# Altium integrated library Altium_WCAP-AT1H (rev20b).IntLib: 94 symbols
Pins are listed as number, name and electrical type; pins without a type are passive.

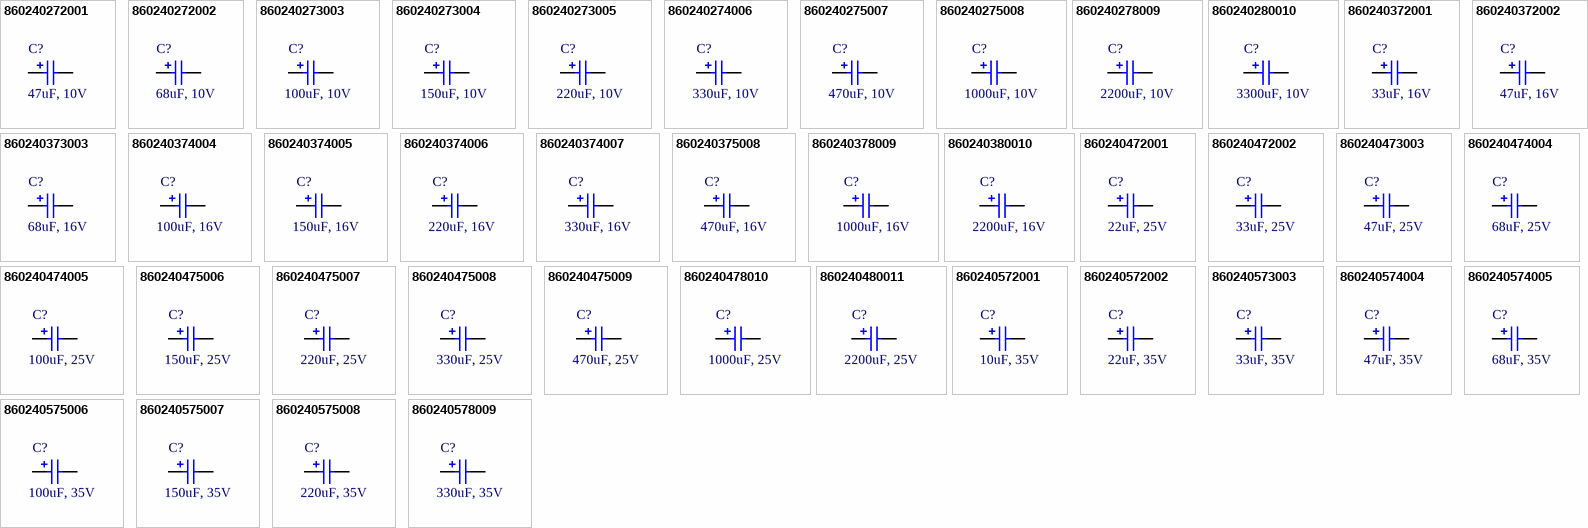
[diagram p0: symbols 860240272001 to 860240578009]

## 860240272001
designator C?, comment 47uF, 10V
WCAP-AT1H Aluminum Electrolytic Capacitor, Radial, THT, D5xH11mm, 47uF, 10V; Manufacturer Part Number: 860240272001; Manufacturer: Wurth Elektronik; Rated Voltage: 10VDC; Technical Reference: ATDC110470M010DSPA3E000; Ripple Current: 100mA; Capacitance Tolerance: +/-20%; Leakage Current: 4.7uA; Endurance: 5000h; Dissipation Factor: 19%; Published Date: October 2020; Operating Temperature: -40 to +105degC; Capacitance: 47uF; Packaging: Ammo Pack; Mounting Technology: THT; Height: 11mm; Diameter: 5mm; ComponentLink2URL: https://www.we-online.com/catalog/datasheet/860240272001.pdf; ComponentLink2Description: Datasheet; ComponentLink1URL: http://www.we-online.de; ComponentLink1Description: Manufacturer
footprint WCAP-AT1H_D5H11
pins: 1 P, 2 N

## 860240272002
designator C?, comment 68uF, 10V
WCAP-AT1H Aluminum Electrolytic Capacitor, Radial, THT, D5xH11mm, 68uF, 10V; Manufacturer Part Number: 860240272002; Manufacturer: Wurth Elektronik; Rated Voltage: 10VDC; Technical Reference: ATDC110680M010DSPA3E000; Ripple Current: 130mA; Capacitance Tolerance: +/-20%; Leakage Current: 6.8uA; Endurance: 5000h; Dissipation Factor: 19%; Published Date: October 2020; Operating Temperature: -40 to +105degC; Capacitance: 68uF; Packaging: Ammo Pack; Mounting Technology: THT; Height: 11mm; Diameter: 5mm; ComponentLink2URL: https://www.we-online.com/catalog/datasheet/860240272002.pdf; ComponentLink2Description: Datasheet; ComponentLink1URL: http://www.we-online.de; ComponentLink1Description: Manufacturer
footprint WCAP-AT1H_D5H11
pins: 1 P, 2 N

## 860240273003
designator C?, comment 100uF, 10V
WCAP-AT1H Aluminum Electrolytic Capacitor, Radial, THT, D6.3xH11mm, 100uF, 10V; Manufacturer Part Number: 860240273003; Manufacturer: Wurth Elektronik; Rated Voltage: 10VDC; Technical Reference: ATDD110101M010DSPA4E000; Ripple Current: 190mA; Capacitance Tolerance: +/-20%; Leakage Current: 10uA; Endurance: 5000h; Dissipation Factor: 19%; Published Date: October 2020; Operating Temperature: -40 to +105degC; Capacitance: 100uF; Packaging: Ammo Pack; Mounting Technology: THT; Height: 11mm; Diameter: 6.3mm; ComponentLink2URL: https://www.we-online.com/catalog/datasheet/860240273003.pdf; ComponentLink2Description: Datasheet; ComponentLink1URL: http://www.we-online.de; ComponentLink1Description: Manufacturer
footprint WCAP-AT1H_D6.3H11
pins: 1 P, 2 N

## 860240273004
designator C?, comment 150uF, 10V
WCAP-AT1H Aluminum Electrolytic Capacitor, Radial, THT, D6.3xH11mm, 150uF, 10V; Manufacturer Part Number: 860240273004; Manufacturer: Wurth Elektronik; Rated Voltage: 10VDC; Technical Reference: ATDD110151M010DSPA4E000; Ripple Current: 220mA; Capacitance Tolerance: +/-20%; Leakage Current: 15uA; Endurance: 5000h; Dissipation Factor: 19%; Published Date: October 2020; Operating Temperature: -40 to +105degC; Capacitance: 150uF; Packaging: Ammo Pack; Mounting Technology: THT; Height: 11mm; Diameter: 6.3mm; ComponentLink2URL: https://www.we-online.com/catalog/datasheet/860240273004.pdf; ComponentLink2Description: Datasheet; ComponentLink1URL: http://www.we-online.de; ComponentLink1Description: Manufacturer
footprint WCAP-AT1H_D6.3H11
pins: 1 P, 2 N

## 860240273005
designator C?, comment 220uF, 10V
WCAP-AT1H Aluminum Electrolytic Capacitor, Radial, THT, D6.3xH11mm, 220uF, 10V; Manufacturer Part Number: 860240273005; Manufacturer: Wurth Elektronik; Rated Voltage: 10VDC; Technical Reference: ATDD110221M010DSPA4E000; Ripple Current: 270mA; Capacitance Tolerance: +/-20%; Leakage Current: 22uA; Endurance: 5000h; Dissipation Factor: 19%; Published Date: October 2020; Operating Temperature: -40 to +105degC; Capacitance: 220uF; Packaging: Ammo Pack; Mounting Technology: THT; Height: 11mm; Diameter: 6.3mm; ComponentLink2URL: https://www.we-online.com/catalog/datasheet/860240273005.pdf; ComponentLink2Description: Datasheet; ComponentLink1URL: http://www.we-online.de; ComponentLink1Description: Manufacturer
footprint WCAP-AT1H_D6.3H11
pins: 1 P, 2 N

## 860240274006
designator C?, comment 330uF, 10V
WCAP-AT1H Aluminum Electrolytic Capacitor, Radial, THT, D8xH11.5mm, 330uF, 10V; Manufacturer Part Number: 860240274006; Manufacturer: Wurth Elektronik; Rated Voltage: 10VDC; Technical Reference: ATDE115331M010DSPA7H000; Ripple Current: 390mA; Capacitance Tolerance: +/-20%; Leakage Current: 33uA; Endurance: 8000h; Dissipation Factor: 19%; Published Date: October 2020; Operating Temperature: -40 to +105degC; Capacitance: 330uF; Packaging: Ammo Pack; Mounting Technology: THT; Height: 11.5mm; Diameter: 8mm; ComponentLink2URL: https://www.we-online.com/catalog/datasheet/860240274006.pdf; ComponentLink2Description: Datasheet; ComponentLink1URL: http://www.we-online.de; ComponentLink1Description: Manufacturer
footprint WCAP-AT1H_D8H11.5
pins: 1 P, 2 N

## 860240275007
designator C?, comment 470uF, 10V
WCAP-AT1H Aluminum Electrolytic Capacitor, Radial, THT, D10xH12.5mm, 470uF, 10V; Manufacturer Part Number: 860240275007; Manufacturer: Wurth Elektronik; Rated Voltage: 10VDC; Technical Reference: ATDF125471M010DSPA9K000; Ripple Current: 540mA; Capacitance Tolerance: +/-20%; Leakage Current: 47uA; Endurance: 10000h; Dissipation Factor: 19%; Published Date: October 2020; Operating Temperature: -40 to +105degC; Capacitance: 470uF; Packaging: Ammo Pack; Mounting Technology: THT; Height: 12.5mm; Diameter: 10mm; ComponentLink2URL: https://www.we-online.com/catalog/datasheet/860240275007.pdf; ComponentLink2Description: Datasheet; ComponentLink1URL: http://www.we-online.de; ComponentLink1Description: Manufacturer
footprint WCAP-AT1H_D10H12.5
pins: 1 P, 2 N

## 860240275008
designator C?, comment 1000uF, 10V
WCAP-AT1H Aluminum Electrolytic Capacitor, Radial, THT, D10xH16mm, 1000uF, 10V; Manufacturer Part Number: 860240275008; Manufacturer: Wurth Elektronik; Rated Voltage: 10VDC; Technical Reference: ATDF160102M010DSPAAK000; Ripple Current: 900mA; Capacitance Tolerance: +/-20%; Leakage Current: 100uA; Endurance: 10000h; Dissipation Factor: 19%; Published Date: October 2020; Operating Temperature: -40 to +105degC; Capacitance: 1000uF; Packaging: Ammo Pack; Mounting Technology: THT; Height: 16mm; Diameter: 10mm; ComponentLink2URL: https://www.we-online.com/catalog/datasheet/860240275008.pdf; ComponentLink2Description: Datasheet; ComponentLink1URL: http://www.we-online.de; ComponentLink1Description: Manufacturer
footprint WCAP-AT1H_D10H16
pins: 1 P, 2 N

## 860240278009
designator C?, comment 2200uF, 10V
WCAP-AT1H Aluminum Electrolytic Capacitor, Radial, THT, D13xH20mm, 2200uF, 10V; Manufacturer Part Number: 860240278009; Manufacturer: Wurth Elektronik; Rated Voltage: 10VDC; Technical Reference: ATDI200222M010DSPACK000; Ripple Current: 1540mA; Capacitance Tolerance: +/-20%; Leakage Current: 220uA; Endurance: 10000h; Dissipation Factor: 19%; Published Date: October 2020; Operating Temperature: -40 to +105degC; Capacitance: 2200uF; Packaging: Ammo Pack; Mounting Technology: THT; Height: 20mm; Diameter: 13mm; ComponentLink2URL: https://www.we-online.com/catalog/datasheet/860240278009.pdf; ComponentLink2Description: Datasheet; ComponentLink1URL: http://www.we-online.de; ComponentLink1Description: Manufacturer
footprint WCAP-AT1H_D13H20
pins: 1 P, 2 N

## 860240280010
designator C?, comment 3300uF, 10V
WCAP-AT1H Aluminum Electrolytic Capacitor, Radial, THT, D16xH25mm, 3300uF, 10V; Manufacturer Part Number: 860240280010; Manufacturer: Wurth Elektronik; Rated Voltage: 10VDC; Technical Reference: ATDK250332M010DSPAEK000; Ripple Current: 1900mA; Capacitance Tolerance: +/-20%; Leakage Current: 330uA; Endurance: 10000h; Dissipation Factor: 19%; Published Date: October 2020; Operating Temperature: -40 to +105degC; Capacitance: 3300uF; Packaging: Ammo Pack; Mounting Technology: THT; Height: 25mm; Diameter: 16mm; ComponentLink2URL: https://www.we-online.com/catalog/datasheet/860240280010.pdf; ComponentLink2Description: Datasheet; ComponentLink1URL: http://www.we-online.de; ComponentLink1Description: Manufacturer
footprint WCAP-AT1H_D16H25
pins: 1 P, 2 N

## 860240372001
designator C?, comment 33uF, 16V
WCAP-AT1H Aluminum Electrolytic Capacitor, Radial, THT, D5xH11mm, 33uF, 16V; Manufacturer Part Number: 860240372001; Manufacturer: Wurth Elektronik; Rated Voltage: 16VDC; Technical Reference: ATDC110330M016DSPA3E000; Ripple Current: 115mA; Capacitance Tolerance: +/-20%; Leakage Current: 5.28uA; Endurance: 5000h; Dissipation Factor: 16%; Published Date: October 2020; Operating Temperature: -40 to +105degC; Capacitance: 33uF; Packaging: Ammo Pack; Mounting Technology: THT; Height: 11mm; Diameter: 5mm; ComponentLink2URL: https://www.we-online.com/catalog/datasheet/860240372001.pdf; ComponentLink2Description: Datasheet; ComponentLink1URL: http://www.we-online.de; ComponentLink1Description: Manufacturer
footprint WCAP-AT1H_D5H11
pins: 1 P, 2 N

## 860240372002
designator C?, comment 47uF, 16V
WCAP-AT1H Aluminum Electrolytic Capacitor, Radial, THT, D5xH11mm, 47uF, 16V; Manufacturer Part Number: 860240372002; Manufacturer: Wurth Elektronik; Rated Voltage: 16VDC; Technical Reference: ATDC110470M016DSPA3E000; Ripple Current: 145mA; Capacitance Tolerance: +/-20%; Leakage Current: 7.52uA; Endurance: 5000h; Dissipation Factor: 16%; Published Date: October 2020; Operating Temperature: -40 to +105degC; Capacitance: 47uF; Packaging: Ammo Pack; Mounting Technology: THT; Height: 11mm; Diameter: 5mm; ComponentLink2URL: https://www.we-online.com/catalog/datasheet/860240372002.pdf; ComponentLink2Description: Datasheet; ComponentLink1URL: http://www.we-online.de; ComponentLink1Description: Manufacturer
footprint WCAP-AT1H_D5H11
pins: 1 P, 2 N

## 860240373003
designator C?, comment 68uF, 16V
WCAP-AT1H Aluminum Electrolytic Capacitor, Radial, THT, D6.3xH11mm, 68uF, 16V; Manufacturer Part Number: 860240373003; Manufacturer: Wurth Elektronik; Rated Voltage: 16VDC; Technical Reference: ATDD110680M016DSPA4E000; Ripple Current: 200mA; Capacitance Tolerance: +/-20%; Leakage Current: 10.88uA; Endurance: 5000h; Dissipation Factor: 16%; Published Date: October 2020; Operating Temperature: -40 to +105degC; Capacitance: 68uF; Packaging: Ammo Pack; Mounting Technology: THT; Height: 11mm; Diameter: 6.3mm; ComponentLink2URL: https://www.we-online.com/catalog/datasheet/860240373003.pdf; ComponentLink2Description: Datasheet; ComponentLink1URL: http://www.we-online.de; ComponentLink1Description: Manufacturer
footprint WCAP-AT1H_D6.3H11
pins: 1 P, 2 N

## 860240374004
designator C?, comment 100uF, 16V
WCAP-AT1H Aluminum Electrolytic Capacitor, Radial, THT, D8xH11.5mm, 100uF, 16V; Manufacturer Part Number: 860240374004; Manufacturer: Wurth Elektronik; Rated Voltage: 16VDC; Technical Reference: ATDE115101M016DSPA7H000; Ripple Current: 245mA; Capacitance Tolerance: +/-20%; Leakage Current: 16uA; Endurance: 8000h; Dissipation Factor: 16%; Published Date: October 2020; Operating Temperature: -40 to +105degC; Capacitance: 100uF; Packaging: Ammo Pack; Mounting Technology: THT; Height: 11.5mm; Diameter: 8mm; ComponentLink2URL: https://www.we-online.com/catalog/datasheet/860240374004.pdf; ComponentLink2Description: Datasheet; ComponentLink1URL: http://www.we-online.de; ComponentLink1Description: Manufacturer
footprint WCAP-AT1H_D8H11.5
pins: 1 P, 2 N

## 860240374005
designator C?, comment 150uF, 16V
WCAP-AT1H Aluminum Electrolytic Capacitor, Radial, THT, D8xH11.5mm, 150uF, 16V; Manufacturer Part Number: 860240374005; Manufacturer: Wurth Elektronik; Rated Voltage: 16VDC; Technical Reference: ATDE115151M016DSPA7H000; Ripple Current: 300mA; Capacitance Tolerance: +/-20%; Leakage Current: 24uA; Endurance: 8000h; Dissipation Factor: 16%; Published Date: October 2020; Operating Temperature: -40 to +105degC; Capacitance: 150uF; Packaging: Ammo Pack; Mounting Technology: THT; Height: 11.5mm; Diameter: 8mm; ComponentLink2URL: https://www.we-online.com/catalog/datasheet/860240374005.pdf; ComponentLink2Description: Datasheet; ComponentLink1URL: http://www.we-online.de; ComponentLink1Description: Manufacturer
footprint WCAP-AT1H_D8H11.5
pins: 1 P, 2 N

## 860240374006
designator C?, comment 220uF, 16V
WCAP-AT1H Aluminum Electrolytic Capacitor, Radial, THT, D8xH11.5mm, 220uF, 16V; Manufacturer Part Number: 860240374006; Manufacturer: Wurth Elektronik; Rated Voltage: 16VDC; Technical Reference: ATDE115221M016DSPA7H000; Ripple Current: 420mA; Capacitance Tolerance: +/-20%; Leakage Current: 35.2uA; Endurance: 8000h; Dissipation Factor: 16%; Published Date: October 2020; Operating Temperature: -40 to +105degC; Capacitance: 220uF; Packaging: Ammo Pack; Mounting Technology: THT; Height: 11.5mm; Diameter: 8mm; ComponentLink2URL: https://www.we-online.com/catalog/datasheet/860240374006.pdf; ComponentLink2Description: Datasheet; ComponentLink1URL: http://www.we-online.de; ComponentLink1Description: Manufacturer
footprint WCAP-AT1H_D8H11.5
pins: 1 P, 2 N

## 860240374007
designator C?, comment 330uF, 16V
WCAP-AT1H Aluminum Electrolytic Capacitor, Radial, THT, D8xH16mm, 330uF, 16V; Manufacturer Part Number: 860240374007; Manufacturer: Wurth Elektronik; Rated Voltage: 16VDC; Technical Reference: ATDE160331M016DSPA7H000; Ripple Current: 500mA; Capacitance Tolerance: +/-20%; Leakage Current: 52.8uA; Endurance: 8000h; Dissipation Factor: 16%; Published Date: October 2020; Operating Temperature: -40 to +105degC; Capacitance: 330uF; Packaging: Ammo Pack; Mounting Technology: THT; Height: 16mm; Diameter: 8mm; ComponentLink2URL: https://www.we-online.com/catalog/datasheet/860240374007.pdf; ComponentLink2Description: Datasheet; ComponentLink1URL: http://www.we-online.de; ComponentLink1Description: Manufacturer
footprint WCAP-AT1H_D8H16
pins: 1 P, 2 N

## 860240375008
designator C?, comment 470uF, 16V
WCAP-AT1H Aluminum Electrolytic Capacitor, Radial, THT, D10xH16mm, 470uF, 16V; Manufacturer Part Number: 860240375008; Manufacturer: Wurth Elektronik; Rated Voltage: 16VDC; Technical Reference: ATDF160471M016DSPAAK000; Ripple Current: 730mA; Capacitance Tolerance: +/-20%; Leakage Current: 75.2uA; Endurance: 10000h; Dissipation Factor: 16%; Published Date: October 2020; Operating Temperature: -40 to +105degC; Capacitance: 470uF; Packaging: Ammo Pack; Mounting Technology: THT; Height: 16mm; Diameter: 10mm; ComponentLink2URL: https://www.we-online.com/catalog/datasheet/860240375008.pdf; ComponentLink2Description: Datasheet; ComponentLink1URL: http://www.we-online.de; ComponentLink1Description: Manufacturer
footprint WCAP-AT1H_D10H16
pins: 1 P, 2 N

## 860240378009
designator C?, comment 1000uF, 16V
WCAP-AT1H Aluminum Electrolytic Capacitor, Radial, THT, D13xH20mm, 1000uF, 16V; Manufacturer Part Number: 860240378009; Manufacturer: Wurth Elektronik; Rated Voltage: 16VDC; Technical Reference: ATDI200102M016DSPACK000; Ripple Current: 1173mA; Capacitance Tolerance: +/-20%; Leakage Current: 160uA; Endurance: 10000h; Dissipation Factor: 16%; Published Date: October 2020; Operating Temperature: -40 to +105degC; Capacitance: 1000uF; Packaging: Ammo Pack; Mounting Technology: THT; Height: 20mm; Diameter: 13mm; ComponentLink2URL: https://www.we-online.com/catalog/datasheet/860240378009.pdf; ComponentLink2Description: Datasheet; ComponentLink1URL: http://www.we-online.de; ComponentLink1Description: Manufacturer
footprint WCAP-AT1H_D13H20
pins: 1 P, 2 N

## 860240380010
designator C?, comment 2200uF, 16V
WCAP-AT1H Aluminum Electrolytic Capacitor, Radial, THT, D16xH25mm, 2200uF, 16V; Manufacturer Part Number: 860240380010; Manufacturer: Wurth Elektronik; Rated Voltage: 16VDC; Technical Reference: ATDK250222M016DSPAEK000; Ripple Current: 2093mA; Capacitance Tolerance: +/-20%; Leakage Current: 352uA; Endurance: 10000h; Dissipation Factor: 16%; Published Date: October 2020; Operating Temperature: -40 to +105degC; Capacitance: 2200uF; Packaging: Ammo Pack; Mounting Technology: THT; Height: 25mm; Diameter: 16mm; ComponentLink2URL: https://www.we-online.com/catalog/datasheet/860240380010.pdf; ComponentLink2Description: Datasheet; ComponentLink1URL: http://www.we-online.de; ComponentLink1Description: Manufacturer
footprint WCAP-AT1H_D16H25
pins: 1 P, 2 N

## 860240472001
designator C?, comment 22uF, 25V
WCAP-AT1H Aluminum Electrolytic Capacitor, Radial, THT, D5xH11mm, 22uF, 25V; Manufacturer Part Number: 860240472001; Manufacturer: Wurth Elektronik; Rated Voltage: 25VDC; Technical Reference: ATDC110220M025DSPA3E000; Ripple Current: 100mA; Capacitance Tolerance: +/-20%; Leakage Current: 5.5uA; Endurance: 5000h; Dissipation Factor: 14%; Published Date: October 2020; Operating Temperature: -40 to +105degC; Capacitance: 22uF; Packaging: Ammo Pack; Mounting Technology: THT; Height: 11mm; Diameter: 5mm; ComponentLink2URL: https://www.we-online.com/catalog/datasheet/860240472001.pdf; ComponentLink2Description: Datasheet; ComponentLink1URL: http://www.we-online.de; ComponentLink1Description: Manufacturer
footprint WCAP-AT1H_D5H11
pins: 1 P, 2 N

## 860240472002
designator C?, comment 33uF, 25V
WCAP-AT1H Aluminum Electrolytic Capacitor, Radial, THT, D5xH11mm, 33uF, 25V; Manufacturer Part Number: 860240472002; Manufacturer: Wurth Elektronik; Rated Voltage: 25VDC; Technical Reference: ATDC110330M025DSPA3E000; Ripple Current: 130mA; Capacitance Tolerance: +/-20%; Leakage Current: 8.25uA; Endurance: 5000h; Dissipation Factor: 14%; Published Date: October 2020; Operating Temperature: -40 to +105degC; Capacitance: 33uF; Packaging: Ammo Pack; Mounting Technology: THT; Height: 11mm; Diameter: 5mm; ComponentLink2URL: https://www.we-online.com/catalog/datasheet/860240472002.pdf; ComponentLink2Description: Datasheet; ComponentLink1URL: http://www.we-online.de; ComponentLink1Description: Manufacturer
footprint WCAP-AT1H_D5H11
pins: 1 P, 2 N

## 860240473003
designator C?, comment 47uF, 25V
WCAP-AT1H Aluminum Electrolytic Capacitor, Radial, THT, D6.3xH11mm, 47uF, 25V; Manufacturer Part Number: 860240473003; Manufacturer: Wurth Elektronik; Rated Voltage: 25VDC; Technical Reference: ATDD110470M025DSPA4E000; Ripple Current: 160mA; Capacitance Tolerance: +/-20%; Leakage Current: 11.75uA; Endurance: 5000h; Dissipation Factor: 14%; Published Date: October 2020; Operating Temperature: -40 to +105degC; Capacitance: 47uF; Packaging: Ammo Pack; Mounting Technology: THT; Height: 11mm; Diameter: 6.3mm; ComponentLink2URL: https://www.we-online.com/catalog/datasheet/860240473003.pdf; ComponentLink2Description: Datasheet; ComponentLink1URL: http://www.we-online.de; ComponentLink1Description: Manufacturer
footprint WCAP-AT1H_D6.3H11
pins: 1 P, 2 N

## 860240474004
designator C?, comment 68uF, 25V
WCAP-AT1H Aluminum Electrolytic Capacitor, Radial, THT, D8xH11.5mm, 68uF, 25V; Manufacturer Part Number: 860240474004; Manufacturer: Wurth Elektronik; Rated Voltage: 25VDC; Technical Reference: ATDE115680M025DSPA7H000; Ripple Current: 230mA; Capacitance Tolerance: +/-20%; Leakage Current: 17uA; Endurance: 8000h; Dissipation Factor: 14%; Published Date: October 2020; Operating Temperature: -40 to +105degC; Capacitance: 68uF; Packaging: Ammo Pack; Mounting Technology: THT; Height: 11.5mm; Diameter: 8mm; ComponentLink2URL: https://www.we-online.com/catalog/datasheet/860240474004.pdf; ComponentLink2Description: Datasheet; ComponentLink1URL: http://www.we-online.de; ComponentLink1Description: Manufacturer
footprint WCAP-AT1H_D8H11.5
pins: 1 P, 2 N

## 860240474005
designator C?, comment 100uF, 25V
WCAP-AT1H Aluminum Electrolytic Capacitor, Radial, THT, D8xH11.5mm, 100uF, 25V; Manufacturer Part Number: 860240474005; Manufacturer: Wurth Elektronik; Rated Voltage: 25VDC; Technical Reference: ATDE115101M025DSPA7H000; Ripple Current: 327mA; Capacitance Tolerance: +/-20%; Leakage Current: 25uA; Endurance: 8000h; Dissipation Factor: 14%; Published Date: October 2020; Operating Temperature: -40 to +105degC; Capacitance: 100uF; Packaging: Ammo Pack; Mounting Technology: THT; Height: 11.5mm; Diameter: 8mm; ComponentLink2URL: https://www.we-online.com/catalog/datasheet/860240474005.pdf; ComponentLink2Description: Datasheet; ComponentLink1URL: http://www.we-online.de; ComponentLink1Description: Manufacturer
footprint WCAP-AT1H_D8H11.5
pins: 1 P, 2 N

## 860240475006
designator C?, comment 150uF, 25V
WCAP-AT1H Aluminum Electrolytic Capacitor, Radial, THT, D10xH12.5mm, 150uF, 25V; Manufacturer Part Number: 860240475006; Manufacturer: Wurth Elektronik; Rated Voltage: 25VDC; Technical Reference: ATDF125151M025DSPA9K000; Ripple Current: 460mA; Capacitance Tolerance: +/-20%; Leakage Current: 37.5uA; Endurance: 10000h; Dissipation Factor: 14%; Published Date: October 2020; Operating Temperature: -40 to +105degC; Capacitance: 150uF; Packaging: Ammo Pack; Mounting Technology: THT; Height: 12.5mm; Diameter: 10mm; ComponentLink2URL: https://www.we-online.com/catalog/datasheet/860240475006.pdf; ComponentLink2Description: Datasheet; ComponentLink1URL: http://www.we-online.de; ComponentLink1Description: Manufacturer
footprint WCAP-AT1H_D10H12.5
pins: 1 P, 2 N

## 860240475007
designator C?, comment 220uF, 25V
WCAP-AT1H Aluminum Electrolytic Capacitor, Radial, THT, D10xH16mm, 220uF, 25V; Manufacturer Part Number: 860240475007; Manufacturer: Wurth Elektronik; Rated Voltage: 25VDC; Technical Reference: ATDF160221M025DSPAAK000; Ripple Current: 580mA; Capacitance Tolerance: +/-20%; Leakage Current: 55uA; Endurance: 10000h; Dissipation Factor: 14%; Published Date: October 2020; Operating Temperature: -40 to +105degC; Capacitance: 220uF; Packaging: Ammo Pack; Mounting Technology: THT; Height: 16mm; Diameter: 10mm; ComponentLink2URL: https://www.we-online.com/catalog/datasheet/860240475007.pdf; ComponentLink2Description: Datasheet; ComponentLink1URL: http://www.we-online.de; ComponentLink1Description: Manufacturer
footprint WCAP-AT1H_D10H16
pins: 1 P, 2 N

## 860240475008
designator C?, comment 330uF, 25V
WCAP-AT1H Aluminum Electrolytic Capacitor, Radial, THT, D10xH20mm, 330uF, 25V; Manufacturer Part Number: 860240475008; Manufacturer: Wurth Elektronik; Rated Voltage: 25VDC; Technical Reference: ATDF200331M025DSPAAK000; Ripple Current: 805mA; Capacitance Tolerance: +/-20%; Leakage Current: 82.5uA; Endurance: 10000h; Dissipation Factor: 14%; Published Date: October 2020; Operating Temperature: -40 to +105degC; Capacitance: 330uF; Packaging: Ammo Pack; Mounting Technology: THT; Height: 20mm; Diameter: 10mm; ComponentLink2URL: https://www.we-online.com/catalog/datasheet/860240475008.pdf; ComponentLink2Description: Datasheet; ComponentLink1URL: http://www.we-online.de; ComponentLink1Description: Manufacturer
footprint WCAP-AT1H_D10H20
pins: 1 P, 2 N

## 860240475009
designator C?, comment 470uF, 25V
WCAP-AT1H Aluminum Electrolytic Capacitor, Radial, THT, D10xH20mm, 470uF, 25V; Manufacturer Part Number: 860240475009; Manufacturer: Wurth Elektronik; Rated Voltage: 25VDC; Technical Reference: ATDF200471M025DSPAAK000; Ripple Current: 950mA; Capacitance Tolerance: +/-20%; Leakage Current: 117.5uA; Endurance: 10000h; Dissipation Factor: 14%; Published Date: October 2020; Operating Temperature: -40 to +105degC; Capacitance: 470uF; Packaging: Ammo Pack; Mounting Technology: THT; Height: 20mm; Diameter: 10mm; ComponentLink2URL: https://www.we-online.com/catalog/datasheet/860240475009.pdf; ComponentLink2Description: Datasheet; ComponentLink1URL: http://www.we-online.de; ComponentLink1Description: Manufacturer
footprint WCAP-AT1H_D10H20
pins: 1 P, 2 N

## 860240478010
designator C?, comment 1000uF, 25V
WCAP-AT1H Aluminum Electrolytic Capacitor, Radial, THT, D13xH25mm, 1000uF, 25V; Manufacturer Part Number: 860240478010; Manufacturer: Wurth Elektronik; Rated Voltage: 25VDC; Technical Reference: ATDI250102M025DSPACK000; Ripple Current: 1552mA; Capacitance Tolerance: +/-20%; Leakage Current: 250uA; Endurance: 10000h; Dissipation Factor: 14%; Published Date: October 2020; Operating Temperature: -40 to +105degC; Capacitance: 1000uF; Packaging: Ammo Pack; Mounting Technology: THT; Height: 25mm; Diameter: 13mm; ComponentLink2URL: https://www.we-online.com/catalog/datasheet/860240478010.pdf; ComponentLink2Description: Datasheet; ComponentLink1URL: http://www.we-online.de; ComponentLink1Description: Manufacturer
footprint WCAP-AT1H_D13H25
pins: 1 P, 2 N

## 860240480011
designator C?, comment 2200uF, 25V
WCAP-AT1H Aluminum Electrolytic Capacitor, Radial, THT, D16xH31.5mm, 2200uF, 25V; Manufacturer Part Number: 860240480011; Manufacturer: Wurth Elektronik; Rated Voltage: 25VDC; Technical Reference: ATDK315222M025DSPADK000; Ripple Current: 2400mA; Capacitance Tolerance: +/-20%; Leakage Current: 550uA; Endurance: 10000h; Dissipation Factor: 14%; Published Date: October 2020; Operating Temperature: -40 to +105degC; Capacitance: 2200uF; Packaging: Ammo Pack; Mounting Technology: THT; Height: 31.5mm; Diameter: 16mm; ComponentLink2URL: https://www.we-online.com/catalog/datasheet/860240480011.pdf; ComponentLink2Description: Datasheet; ComponentLink1URL: http://www.we-online.de; ComponentLink1Description: Manufacturer
footprint WCAP-AT1H_D16H31.5
pins: 1 P, 2 N

## 860240572001
designator C?, comment 10uF, 35V
WCAP-AT1H Aluminum Electrolytic Capacitor, Radial, THT, D5xH11mm, 10uF, 35V; Manufacturer Part Number: 860240572001; Manufacturer: Wurth Elektronik; Rated Voltage: 35VDC; Technical Reference: ATDC110100M035DSPA3E000; Ripple Current: 65mA; Capacitance Tolerance: +/-20%; Leakage Current: 3.5uA; Endurance: 5000h; Dissipation Factor: 12%; Published Date: October 2020; Operating Temperature: -40 to +105degC; Capacitance: 10uF; Packaging: Ammo Pack; Mounting Technology: THT; Height: 11mm; Diameter: 5mm; ComponentLink2URL: https://www.we-online.com/catalog/datasheet/860240572001.pdf; ComponentLink2Description: Datasheet; ComponentLink1URL: http://www.we-online.de; ComponentLink1Description: Manufacturer
footprint WCAP-AT1H_D5H11
pins: 1 P, 2 N

## 860240572002
designator C?, comment 22uF, 35V
WCAP-AT1H Aluminum Electrolytic Capacitor, Radial, THT, D5xH11mm, 22uF, 35V; Manufacturer Part Number: 860240572002; Manufacturer: Wurth Elektronik; Rated Voltage: 35VDC; Technical Reference: ATDC110220M035DSPA3E000; Ripple Current: 125mA; Capacitance Tolerance: +/-20%; Leakage Current: 7.7uA; Endurance: 5000h; Dissipation Factor: 12%; Published Date: October 2020; Operating Temperature: -40 to +105degC; Capacitance: 22uF; Packaging: Ammo Pack; Mounting Technology: THT; Height: 11mm; Diameter: 5mm; ComponentLink2URL: https://www.we-online.com/catalog/datasheet/860240572002.pdf; ComponentLink2Description: Datasheet; ComponentLink1URL: http://www.we-online.de; ComponentLink1Description: Manufacturer
footprint WCAP-AT1H_D5H11
pins: 1 P, 2 N

## 860240573003
designator C?, comment 33uF, 35V
WCAP-AT1H Aluminum Electrolytic Capacitor, Radial, THT, D6.3xH11mm, 33uF, 35V; Manufacturer Part Number: 860240573003; Manufacturer: Wurth Elektronik; Rated Voltage: 35VDC; Technical Reference: ATDD110330M035DSPA4E000; Ripple Current: 178mA; Capacitance Tolerance: +/-20%; Leakage Current: 11.55uA; Endurance: 5000h; Dissipation Factor: 12%; Published Date: October 2020; Operating Temperature: -40 to +105degC; Capacitance: 33uF; Packaging: Ammo Pack; Mounting Technology: THT; Height: 11mm; Diameter: 6.3mm; ComponentLink2URL: https://www.we-online.com/catalog/datasheet/860240573003.pdf; ComponentLink2Description: Datasheet; ComponentLink1URL: http://www.we-online.de; ComponentLink1Description: Manufacturer
footprint WCAP-AT1H_D6.3H11
pins: 1 P, 2 N

## 860240574004
designator C?, comment 47uF, 35V
WCAP-AT1H Aluminum Electrolytic Capacitor, Radial, THT, D8xH11.5mm, 47uF, 35V; Manufacturer Part Number: 860240574004; Manufacturer: Wurth Elektronik; Rated Voltage: 35VDC; Technical Reference: ATDE115470M035DSPA7H000; Ripple Current: 240mA; Capacitance Tolerance: +/-20%; Leakage Current: 16.45uA; Endurance: 8000h; Dissipation Factor: 12%; Published Date: October 2020; Operating Temperature: -40 to +105degC; Capacitance: 47uF; Packaging: Ammo Pack; Mounting Technology: THT; Height: 11.5mm; Diameter: 8mm; ComponentLink2URL: https://www.we-online.com/catalog/datasheet/860240574004.pdf; ComponentLink2Description: Datasheet; ComponentLink1URL: http://www.we-online.de; ComponentLink1Description: Manufacturer
footprint WCAP-AT1H_D8H11.5
pins: 1 P, 2 N

## 860240574005
designator C?, comment 68uF, 35V
WCAP-AT1H Aluminum Electrolytic Capacitor, Radial, THT, D8xH11.5mm, 68uF, 35V; Manufacturer Part Number: 860240574005; Manufacturer: Wurth Elektronik; Rated Voltage: 35VDC; Technical Reference: ATDE115680M035DSPA7H000; Ripple Current: 270mA; Capacitance Tolerance: +/-20%; Leakage Current: 23.8uA; Endurance: 8000h; Dissipation Factor: 12%; Published Date: October 2020; Operating Temperature: -40 to +105degC; Capacitance: 68uF; Packaging: Ammo Pack; Mounting Technology: THT; Height: 11.5mm; Diameter: 8mm; ComponentLink2URL: https://www.we-online.com/catalog/datasheet/860240574005.pdf; ComponentLink2Description: Datasheet; ComponentLink1URL: http://www.we-online.de; ComponentLink1Description: Manufacturer
footprint WCAP-AT1H_D8H11.5
pins: 1 P, 2 N

## 860240575006
designator C?, comment 100uF, 35V
WCAP-AT1H Aluminum Electrolytic Capacitor, Radial, THT, D10xH12.5mm, 100uF, 35V; Manufacturer Part Number: 860240575006; Manufacturer: Wurth Elektronik; Rated Voltage: 35VDC; Technical Reference: ATDF125101M035DSPA9K000; Ripple Current: 390mA; Capacitance Tolerance: +/-20%; Leakage Current: 35uA; Endurance: 10000h; Dissipation Factor: 12%; Published Date: October 2020; Operating Temperature: -40 to +105degC; Capacitance: 100uF; Packaging: Ammo Pack; Mounting Technology: THT; Height: 12.5mm; Diameter: 10mm; ComponentLink2URL: https://www.we-online.com/catalog/datasheet/860240575006.pdf; ComponentLink2Description: Datasheet; ComponentLink1URL: http://www.we-online.de; ComponentLink1Description: Manufacturer
footprint WCAP-AT1H_D10H12.5
pins: 1 P, 2 N

## 860240575007
designator C?, comment 150uF, 35V
WCAP-AT1H Aluminum Electrolytic Capacitor, Radial, THT, D10xH16mm, 150uF, 35V; Manufacturer Part Number: 860240575007; Manufacturer: Wurth Elektronik; Rated Voltage: 35VDC; Technical Reference: ATDF160151M035DSPAAK000; Ripple Current: 632mA; Capacitance Tolerance: +/-20%; Leakage Current: 52.5uA; Endurance: 10000h; Dissipation Factor: 12%; Published Date: October 2020; Operating Temperature: -40 to +105degC; Capacitance: 150uF; Packaging: Ammo Pack; Mounting Technology: THT; Height: 16mm; Diameter: 10mm; ComponentLink2URL: https://www.we-online.com/catalog/datasheet/860240575007.pdf; ComponentLink2Description: Datasheet; ComponentLink1URL: http://www.we-online.de; ComponentLink1Description: Manufacturer
footprint WCAP-AT1H_D10H16
pins: 1 P, 2 N

## 860240575008
designator C?, comment 220uF, 35V
WCAP-AT1H Aluminum Electrolytic Capacitor, Radial, THT, D10xH20mm, 220uF, 35V; Manufacturer Part Number: 860240575008; Manufacturer: Wurth Elektronik; Rated Voltage: 35VDC; Technical Reference: ATDF200221M035DSPAAK000; Ripple Current: 760mA; Capacitance Tolerance: +/-20%; Leakage Current: 77uA; Endurance: 10000h; Dissipation Factor: 12%; Published Date: October 2020; Operating Temperature: -40 to +105degC; Capacitance: 220uF; Packaging: Ammo Pack; Mounting Technology: THT; Height: 20mm; Diameter: 10mm; ComponentLink2URL: https://www.we-online.com/catalog/datasheet/860240575008.pdf; ComponentLink2Description: Datasheet; ComponentLink1URL: http://www.we-online.de; ComponentLink1Description: Manufacturer
footprint WCAP-AT1H_D10H20
pins: 1 P, 2 N

## 860240578009
designator C?, comment 330uF, 35V
WCAP-AT1H Aluminum Electrolytic Capacitor, Radial, THT, D13xH20mm, 330uF, 35V; Manufacturer Part Number: 860240578009; Manufacturer: Wurth Elektronik; Rated Voltage: 35VDC; Technical Reference: ATDI200331M035DSPACK000; Ripple Current: 1035mA; Capacitance Tolerance: +/-20%; Leakage Current: 115.5uA; Endurance: 10000h; Dissipation Factor: 12%; Published Date: October 2020; Operating Temperature: -40 to +105degC; Capacitance: 330uF; Packaging: Ammo Pack; Mounting Technology: THT; Height: 20mm; Diameter: 13mm; ComponentLink2URL: https://www.we-online.com/catalog/datasheet/860240578009.pdf; ComponentLink2Description: Datasheet; ComponentLink1URL: http://www.we-online.de; ComponentLink1Description: Manufacturer
footprint WCAP-AT1H_D13H20
pins: 1 P, 2 N

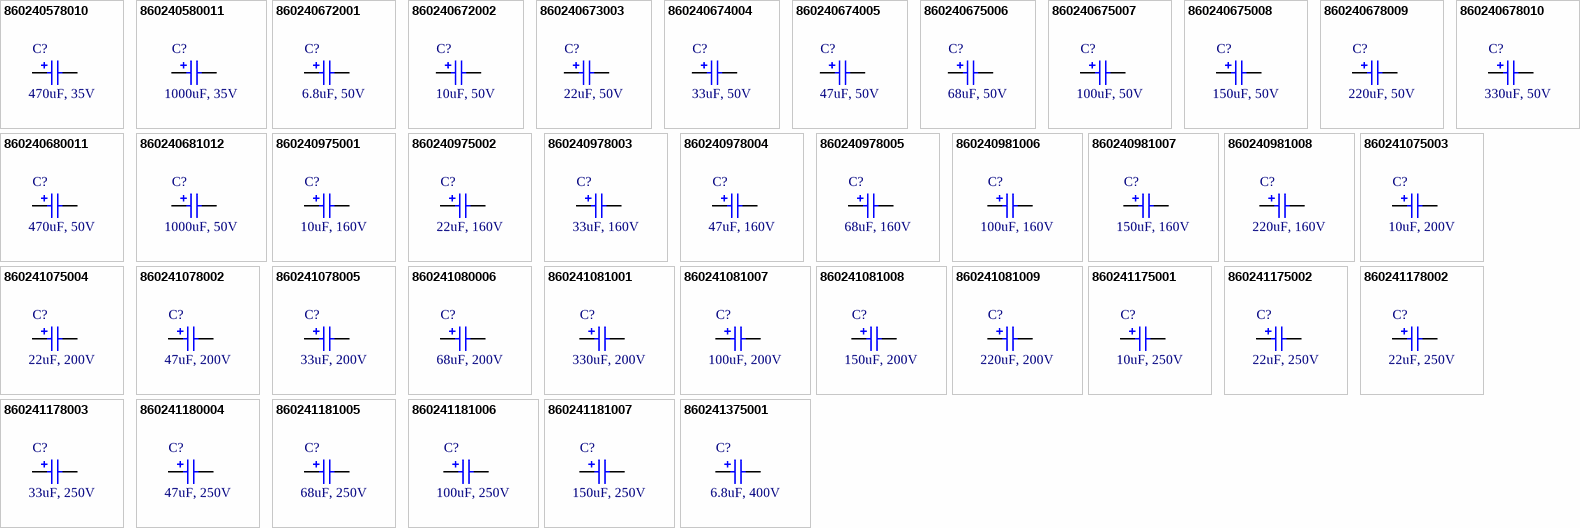
[diagram p1: symbols 860240578010 to 860241375001]

## 860240578010
designator C?, comment 470uF, 35V
WCAP-AT1H Aluminum Electrolytic Capacitor, Radial, THT, D13xH25mm, 470uF, 35V; Manufacturer Part Number: 860240578010; Manufacturer: Wurth Elektronik; Rated Voltage: 35VDC; Technical Reference: ATDI250471M035DSPACK000; Ripple Current: 1100mA; Capacitance Tolerance: +/-20%; Leakage Current: 164.5uA; Endurance: 10000h; Dissipation Factor: 12%; Published Date: October 2020; Operating Temperature: -40 to +105degC; Capacitance: 470uF; Packaging: Ammo Pack; Mounting Technology: THT; Height: 25mm; Diameter: 13mm; ComponentLink2URL: https://www.we-online.com/catalog/datasheet/860240578010.pdf; ComponentLink2Description: Datasheet; ComponentLink1URL: http://www.we-online.de; ComponentLink1Description: Manufacturer
footprint WCAP-AT1H_D13H25
pins: 1 P, 2 N

## 860240580011
designator C?, comment 1000uF, 35V
WCAP-AT1H Aluminum Electrolytic Capacitor, Radial, THT, D16xH31.5mm, 1000uF, 35V; Manufacturer Part Number: 860240580011; Manufacturer: Wurth Elektronik; Rated Voltage: 35VDC; Technical Reference: ATDK315102M035DSPADK000; Ripple Current: 1932mA; Capacitance Tolerance: +/-20%; Leakage Current: 350uA; Endurance: 10000h; Dissipation Factor: 12%; Published Date: October 2020; Operating Temperature: -40 to +105degC; Capacitance: 1000uF; Packaging: Ammo Pack; Mounting Technology: THT; Height: 31.5mm; Diameter: 16mm; ComponentLink2URL: https://www.we-online.com/catalog/datasheet/860240580011.pdf; ComponentLink2Description: Datasheet; ComponentLink1URL: http://www.we-online.de; ComponentLink1Description: Manufacturer
footprint WCAP-AT1H_D16H31.5
pins: 1 P, 2 N

## 860240672001
designator C?, comment 6.8uF, 50V
WCAP-AT1H Aluminum Electrolytic Capacitor, Radial, THT, D5xH11mm, 6.8uF, 50V; Manufacturer Part Number: 860240672001; Manufacturer: Wurth Elektronik; Rated Voltage: 50VDC; Technical Reference: ATDC1106R8M050DSPA3E000; Ripple Current: 75mA; Capacitance Tolerance: +/-20%; Leakage Current: 3.4uA; Endurance: 5000h; Dissipation Factor: 10%; Published Date: October 2020; Operating Temperature: -40 to +105degC; Capacitance: 6.8uF; Packaging: Ammo Pack; Mounting Technology: THT; Height: 11mm; Diameter: 5mm; ComponentLink2URL: https://www.we-online.com/catalog/datasheet/860240672001.pdf; ComponentLink2Description: Datasheet; ComponentLink1URL: http://www.we-online.de; ComponentLink1Description: Manufacturer
footprint WCAP-AT1H_D5H11
pins: 1 P, 2 N

## 860240672002
designator C?, comment 10uF, 50V
WCAP-AT1H Aluminum Electrolytic Capacitor, Radial, THT, D5xH11mm, 10uF, 50V; Manufacturer Part Number: 860240672002; Manufacturer: Wurth Elektronik; Rated Voltage: 50VDC; Technical Reference: ATDC110100M050DSPA3E000; Ripple Current: 97mA; Capacitance Tolerance: +/-20%; Leakage Current: 5uA; Endurance: 5000h; Dissipation Factor: 10%; Published Date: October 2020; Operating Temperature: -40 to +105degC; Capacitance: 10uF; Packaging: Ammo Pack; Mounting Technology: THT; Height: 11mm; Diameter: 5mm; ComponentLink2URL: https://www.we-online.com/catalog/datasheet/860240672002.pdf; ComponentLink2Description: Datasheet; ComponentLink1URL: http://www.we-online.de; ComponentLink1Description: Manufacturer
footprint WCAP-AT1H_D5H11
pins: 1 P, 2 N
